# Altium footprint library Amirreza.PcbLib: 524 footprints (part 20 of 33)
Each footprint in its own frame and in the unit in brackets; x right, y up, seen from the top. Pads: shape width x height; smd on the part's side, far side on the other; paste and mask are expansions set on the pad; w line width, h text height; cw(c..) or ccw(c..) is an arc to the next point about the centre after c.
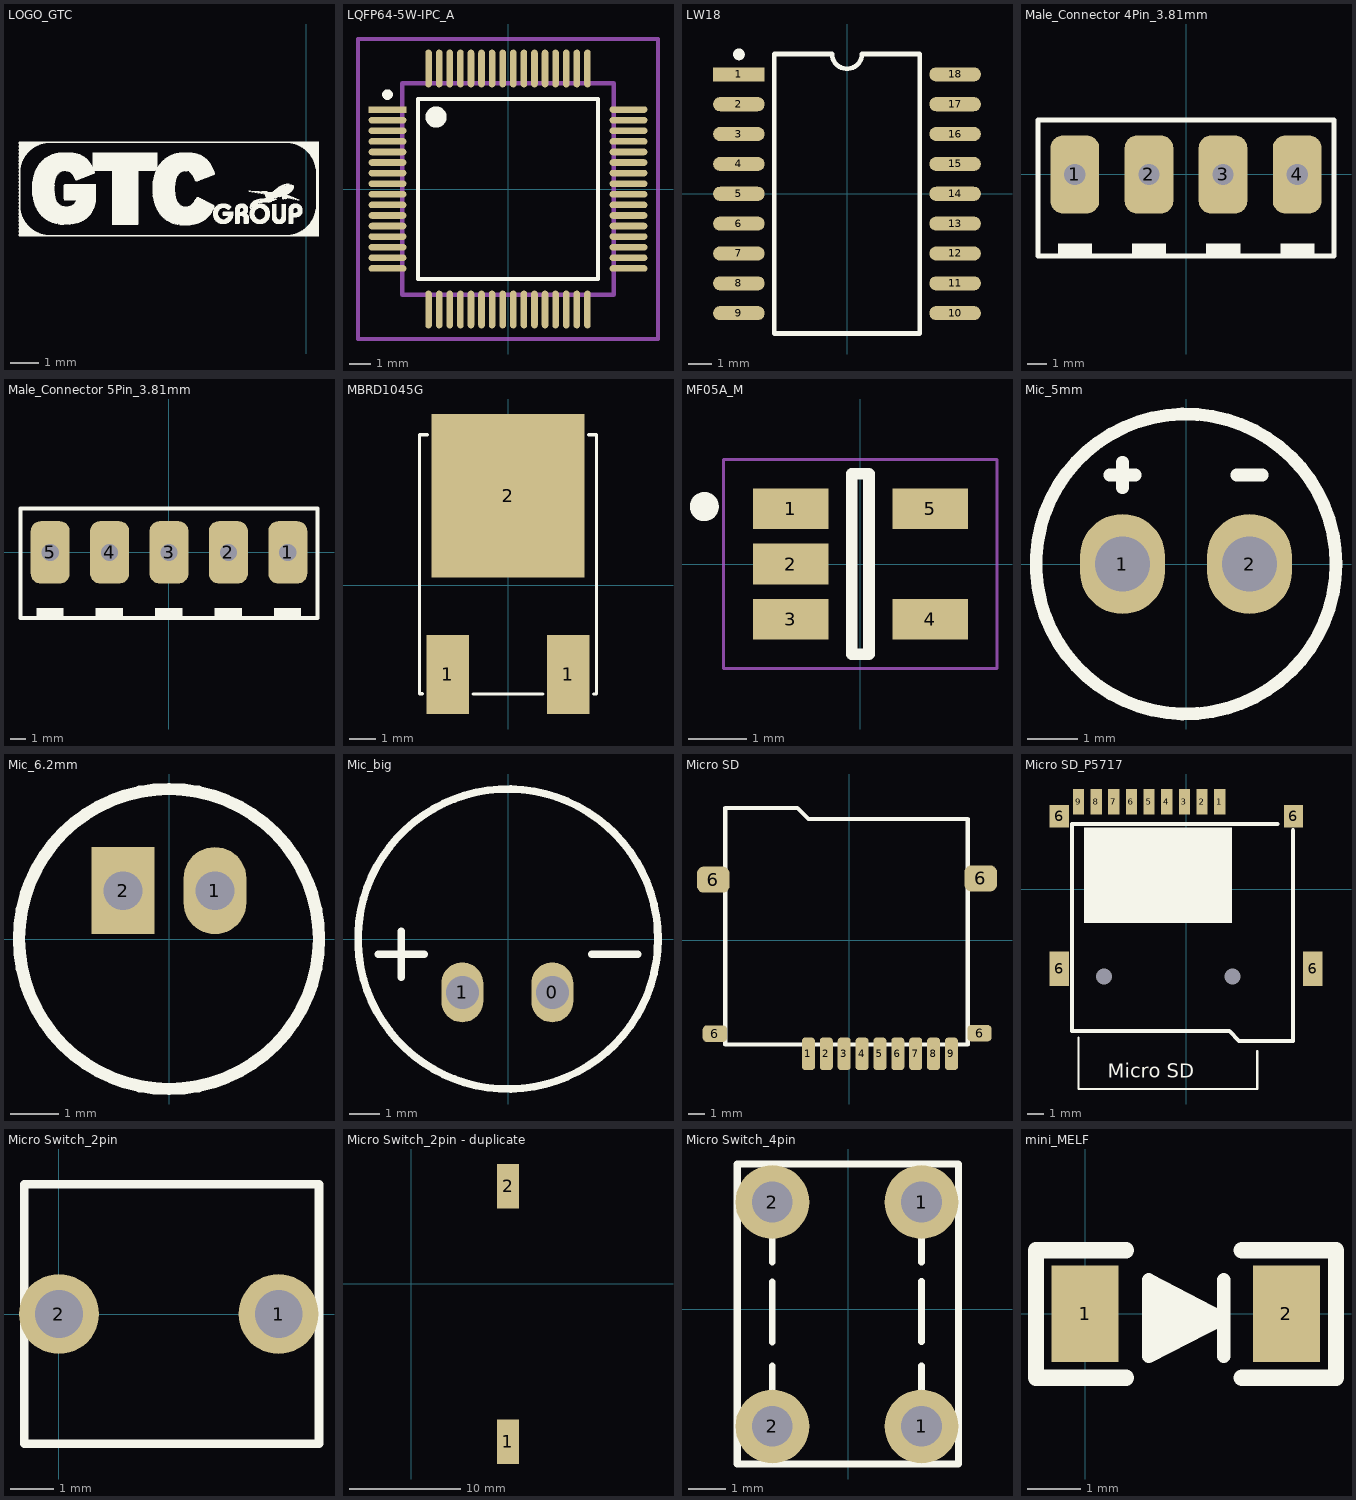
[diagram p19: the footprints below, top view; thin cyan lines are the x and y axes]

## LOGO_GTC [mm]
Top Overlay:
  drawing of 10 lines, arcs and shapes, not listed

## LQFP64-5W-IPC_A [mm]
pads (64):
  rect 1.788x0.312 smd paste+0 mask+0: 1(-5.691,3.75)
  rrect100% 1.788x0.312 smd paste+0 mask+0: 2(-5.691,3.25) 3(-5.691,2.75) 4(-5.691,2.25) 5(-5.691,1.75) 6(-5.691,1.25) 7(-5.691,0.75) 8(-5.691,0.25) 9(-5.691,-0.25) 10(-5.691,-0.75) 11(-5.691,-1.25) 12(-5.691,-1.75) 13(-5.691,-2.25) 14(-5.691,-2.75) 15(-5.691,-3.25) 16(-5.691,-3.75) 33(5.691,-3.75) 34(5.691,-3.25) 35(5.691,-2.75) 36(5.691,-2.25) 37(5.691,-1.75) 38(5.691,-1.25) 39(5.691,-0.75) 40(5.691,-0.25) 41(5.691,0.25) 42(5.691,0.75) 43(5.691,1.25) 44(5.691,1.75) 45(5.691,2.25) 46(5.691,2.75) 47(5.691,3.25) 48(5.691,3.75)
  rrect100% 0.312x1.788 smd paste+0 mask+0: 17(-3.75,-5.691) 18(-3.25,-5.691) 19(-2.75,-5.691) 20(-2.25,-5.691) 21(-1.75,-5.691) 22(-1.25,-5.691) 23(-0.75,-5.691) 24(-0.25,-5.691) 25(0.25,-5.691) 26(0.75,-5.691) 27(1.25,-5.691) 28(1.75,-5.691) 29(2.25,-5.691) 30(2.75,-5.691) 31(3.25,-5.691) 32(3.75,-5.691) 49(3.75,5.691) 50(3.25,5.691) 51(2.75,5.691) 52(2.25,5.691) 53(1.75,5.691) 54(1.25,5.691) 55(0.75,5.691) 56(0.25,5.691) 57(-0.25,5.691) 58(-0.75,5.691) 59(-1.25,5.691) 60(-1.75,5.691) 61(-2.25,5.691) 62(-2.75,5.691) 63(-3.25,5.691) 64(-3.75,5.691)
Top Overlay:
  circle w0.5: c-3.4,3.4 r0.25
  circle w0.25: c-5.691,4.46 r0.125
  lines w0.2: -4.25,-4.25 -4.25,4.25 4.25,4.25 4.25,-4.25 -4.25,-4.25
Mechanical 1:
  lines w0.2: -5,-5 -5,5 5,5 5,-5 -5,-5
Top Assembly:
  lines w0.2: -7.085,-7.085 -7.085,7.085 7.085,7.085 7.085,-7.085 -7.085,-7.085
3D body "IC_STMicroelectronics_STM32L431RCT6_eec.STEP": height 1.6, standoff 0, extent -5.999,-6.001 6.001,5.999

## LW18 [mm]
pads (18):
  rect 2.2x0.6 smd: 1(-4.6,5.08)
  oval 2.2x0.6 smd: 2(-4.6,3.81) 3(-4.6,2.54) 4(-4.6,1.27) 5(-4.6,0) 6(-4.6,-1.27) 7(-4.6,-2.54) 8(-4.6,-3.81) 9(-4.6,-5.08) 10(4.6,-5.08) 11(4.6,-3.81) 12(4.6,-2.54) 13(4.6,-1.27) 14(4.6,0) 15(4.6,1.27) 16(4.6,2.54) 17(4.6,3.81) 18(4.6,5.08)
Top Overlay:
  circle w0.25: c-4.6,5.93 r0.125
  lines w0.2: -3.1,-5.95 -3.1,5.95 -0.635,5.95 ccw(c0,5.95) 0.635,5.95 3.1,5.95 3.1,-5.95 -3.1,-5.95
3D body "User Library-SOIC18-300.step": height 2.65, standoff 0, extent -5.15,-5.765 5.15,5.765

## Male_Connector 4Pin_3.81mm [mm]
pads (4):
  rrect50% 2.5x4 hole 1.1: 1(-5.715,0) 2(-1.905,0) 3(1.905,0) 4(5.715,0)
Top Overlay:
  rectangle: 4.851,-4.293 6.604,-3.556
  rectangle: 1.041,-4.293 2.794,-3.556
  rectangle: -2.769,-4.293 -1.016,-3.556
  rectangle: -6.579,-4.293 -4.826,-3.556
  lines w0.254: -7.62,2.8 -7.62,-4.2 7.62,-4.2 7.62,2.8 -7.614,2.8
3D body "User Library-kf2edgv-3-5-4p.step": height 9.4, standoff -3.5, extent -7.35,-4.293 7.35,2.907

## Male_Connector 5Pin_3.81mm [mm]
pads (5):
  rrect50% 2.5x4 hole 1.1: 1(7.62,0) 2(3.81,0) 3(0,0) 4(-3.81,0) 5(-7.62,0)
Top Overlay:
  region: -6.758,-3.556 -8.511,-3.556 -8.511,-4.293 -6.758,-4.293
  region: -2.948,-3.556 -4.701,-3.556 -4.701,-4.293 -2.948,-4.293
  region: 0.862,-3.556 -0.891,-3.556 -0.891,-4.293 0.862,-4.293
  region: 4.672,-3.556 2.919,-3.556 2.919,-4.293 4.672,-4.293
  region: 8.482,-3.556 6.729,-3.556 6.729,-4.293 8.482,-4.293
  lines w0.254: 9.519,2.8 -9.525,2.8 -9.525,-4.2 9.525,-4.2 9.525,2.8

## MBRD1045G [mm]
pads (3):
  rect 1.6x3 smd: 1(-2.285,-3.39) 1(2.285,-3.39)
  rect 5.8x6.2 smd: 2(0,3.39)
Top Overlay:
  lines w0.127: -3.251,-4.128 -3.357,-4.128 -3.357,5.699 -3.066,5.701 ; -1.321,-4.132 1.321,-4.132 ; 3.067,5.702 3.355,5.703 3.355,-4.129 3.249,-4.129
3D body "User Library-TO252AA (1).step": height 2.3, standoff -0.01, extent -3.29,-4.064 3.29,5.636

## MF05A_M [mm] "SOT23, 5-Leads, Body 2.9x1.6mm, Pitch 0.95mm, Lead Span 2.8mm, IPC Low Density"
height 1.19
pads (5):
  rect 1.3x0.7 smd: 1(-1.2,0.95) 2(-1.2,0) 3(-1.2,-0.95) 4(1.2,-0.95) 5(1.2,0.95)
Top Overlay:
  circle w0.25: c-2.684,0.988 r0.125
  lines w0.2: -0.15,-1.55 -0.15,1.55 0.15,1.55 0.15,-1.55 -0.15,-1.55
Mechanical 13:
  lines w0.05: -2.35,-1.8 2.35,-1.8 2.35,1.8 -2.35,1.8 -2.35,-1.8
3D body: height 1.19, standoff 0, extent -0.9,-1.55 0.9,1.55

## Mic_5mm [mm]
pads (2):
  oval 1.7x2 hole 1.1: 1(-1.27,0) 2(1.27,0)
Top Overlay:
  circle w0.254: c0,0 r3
  lines w0.254: -1.524,1.778 -1.016,1.778 ; -1.27,1.524 -1.27,2.032 ; 1.016,1.778 1.524,1.778

## Mic_6.2mm [mm]
pads (2):
  oval 1.3x1.8 hole 0.8: 1(0.95,1)
  rect 1.3x1.8 hole 0.8: 2(-0.95,1)
Top Overlay:
  circle w0.254: c0,0 r3.1
Bottom Overlay:
  lines w0.254: -1.27,-0.762 -0.762,-0.762 ; 0.635,-0.762 1.143,-0.762 ; 0.889,-1.016 0.889,-0.508
3D body "User Library-6022microphone.step": height 2.21, standoff -2.85, extent -3,-3.051 3,2.949

## Mic_big [mm]
pads (2):
  oval 1.4x2 hole 1.1: 0(1.476,-1.778) 1(-1.524,-1.778)
Top Overlay:
  circle w0.254: c0,0 r5
  lines w0.254: -4.318,-0.508 -2.794,-0.508 ; -3.556,-1.27 -3.556,0.254 ; 2.794,-0.508 4.318,-0.508

## Micro SD [mm]
pads (13):
  rrect50% 0.8x2 smd: 1(-2.5,-7) 2(-1.4,-7) 3(-0.3,-7) 4(0.8,-7) 5(1.9,-7) 6(3,-7) 7(4.1,-7) 8(5.2,-7) 9(6.3,-7)
  rrect50% 2x1.6 smd: 6(-8.356,3.719) 6(8.103,3.795)
  rrect50% 1.5x1.02 smd: 6(-8.254,-5.755) 6(8.027,-5.73)
Top Overlay:
  lines w0.254: -1.846,7.453 -1.842,7.453 5.194,7.453 ; 4.447,7.453 7.302,7.453 -2.502,7.453 -3.184,8.134 -3.696,8.134 -7.618,8.134 -7.618,-6.416 7.302,-6.416 7.302,7.427

## Micro SD_P5717 [mm]
pads (15):
  round 0 hole 1: 0(-5.1,-5.45) 0(2.9,-5.45)
  rect 0.7x1.6 smd: 1(2.1,5.45) 2(1,5.45) 3(-0.1,5.45) 4(-1.2,5.45) 5(-2.3,5.45) 6(-3.4,5.45) 7(-4.5,5.45) 8(-5.6,5.45) 9(-6.7,5.45)
  rect 1.2x2.15 smd: 6(-7.9,-4.95) 6(7.9,-4.95)
  rect 1.2x1.4 smd: 6(-7.9,4.55) 6(6.7,4.55)
Top Overlay:
  rectangle: -6.37,-2.087 2.876,3.856
  lines w0.15: -6.7,-9.25 -6.7,-12.45 4.451,-12.45 4.451,-10.085
  lines w0.254: 5.695,4.059 -7.106,4.059 -7.106,-8.844 2.698,-8.844 3.304,-9.45 6.66,-9.45 6.66,3.678
  text "Micro SD" at -4.871,-12.07 h1.52
3D body "User Library-micro-sd-card.step": height 2.2, standoff -0.5, extent -8.199,-11.482 7.901,5.718

## Micro Switch_2pin [mm]
pads (2):
  round 1.85 hole 1.1: 1(5.08,0) 2(0,0)
Top Overlay:
  lines w0.2: -0.805,-3 6.015,-3 6.015,3 -0.805,3 -0.805,-2.965

## Micro Switch_2pin - duplicate [mm]
pads (2):
  rect 2x4 all layers, no hole: 1(8.712,-14.199) 2(8.712,8.763)

## Micro Switch_4pin [mm]
pads (4):
  round 2 hole 1.1: 1(1.986,-3.173) 1(1.986,2.907) 2(-2.054,-3.173) 2(-2.054,2.907)
Top Overlay:
  lines w0.178: -2.054,-3.173 -2.054,-1.536 ; -2.054,-0.889 -2.054,0.748 ; -2.054,1.27 -2.054,2.907 ; 1.986,-3.161 1.986,-1.524 ; 1.986,-0.875 1.986,0.762 ; 1.986,1.27 1.986,2.907
  lines w0.2: -3.006,-4.191 2.989,-4.191 2.989,3.937 -3.006,3.937 -3.006,-4.191

## mini_MELF [mm]
pads (2):
  rect 1.25x1.8 smd: 1(0,0) 2(3.75,0)
Top Overlay:
  rectangle: 1.183,-0.187 2.331,0.036
  region: 1.281,0.668 1.092,0.399 2.057,-0.279 2.247,-0.01
  region: 1.118,-0.423 1.294,-0.749 2.333,-0.189 2.157,0.136
  rectangle: 1.183,-0.489 1.776,0.372
  lines w0.254: 2.58,-0.791 2.58,0.63 ; 1.183,-0.791 2.566,-0.085 1.183,0.63 1.183,-0.791
  lines w0.305: -0.914,-1.19 0.762,-1.19 ; -0.914,-1.143 -0.914,1.185 0.762,1.185 ; 2.921,-1.19 4.674,-1.19 ; 2.921,1.185 4.674,1.185 4.674,-1.143
3D body "User Library-MiniMelf-2.SLDPRT": height 1.59, standoff 0, extent 0.034,-0.798 3.734,0.798